# Altium footprint library Components.PcbLib: 111 footprints (part 5 of 7)
Each footprint in its own frame and in the unit in brackets; x right, y up, seen from the top. Pads: shape width x height; smd on the part's side, far side on the other; paste and mask are expansions set on the pad; w line width, h text height; cw(c..) or ccw(c..) is an arc to the next point about the centre after c.
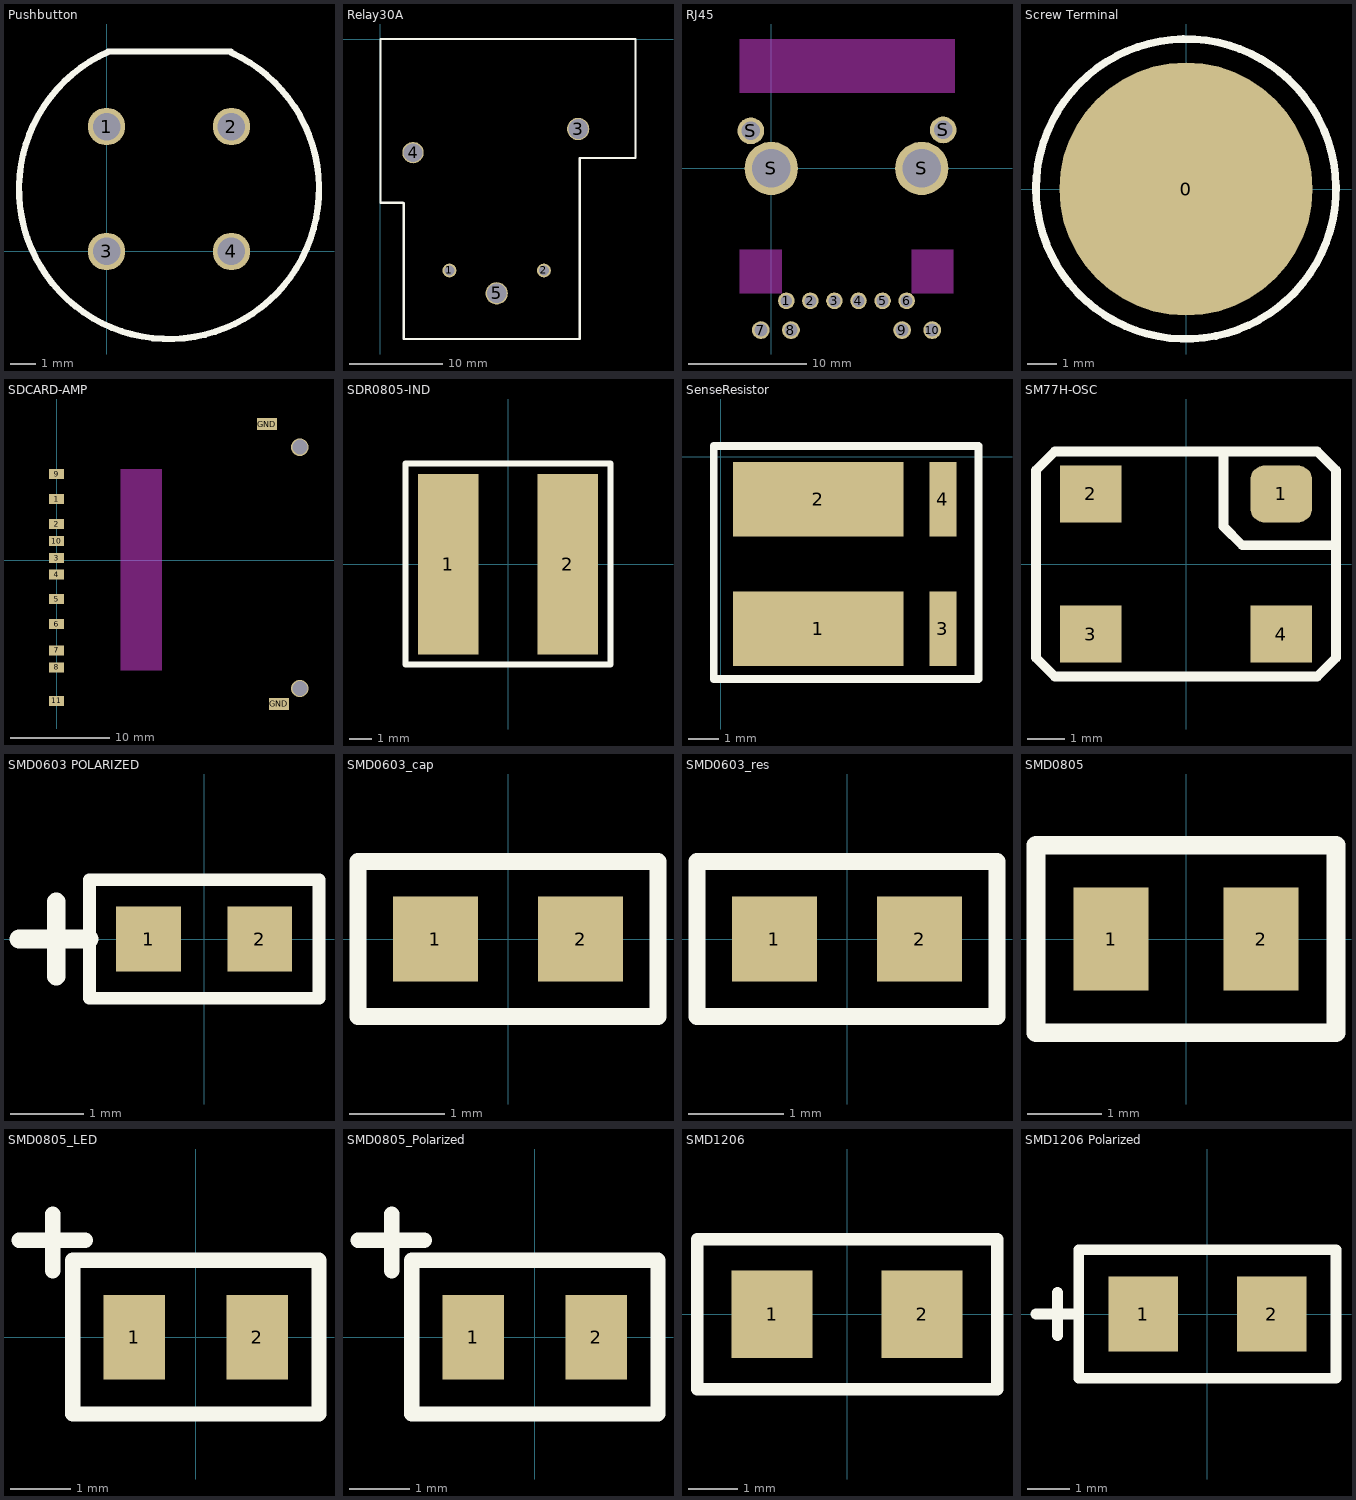
[diagram p4: the footprints below, top view; thin cyan lines are the x and y axes]

## Pushbutton [mm]
pads (4):
  round 1.5 hole 1.1: 1(0,5) 2(5,5) 3(0,0) 4(5,0)
Top Overlay:
  lines w0.254: 0.059,7.981 ccw(c2.5,2.5) 4.983,7.962 ; 0.059,8 4.983,8
3D body: height 14.35, standoff 1.55, extent -3.5,-3.5 8.5,8

## Relay30A [mm]
height 20.4
pads (5):
  round 1.5 hole 1.1: 1(7.417,-24.892) 2(17.577,-24.892)
  round 2.4 hole 2.1: 3(21.26,-9.677) 5(12.497,-27.356)
  round 2.3 hole 2: 4(3.505,-12.217)
Top Overlay:
  lines w0.254: 2.413,-17.602 0,-17.602 0,0 27.432,0 27.432,-12.802 21.412,-12.802 21.412,-32.258 2.489,-32.258 2.489,-17.678

## RJ45 [mm]
pads (14):
  round 1.4 hole 1: 1(1.27,-11.17) 2(3.3,-11.17) 3(5.33,-11.17) 4(7.36,-11.17) 5(9.39,-11.17) 6(11.42,-11.17)
  round 1.5 hole 1.1: 7(-0.88,-13.64) 8(1.66,-13.64) 9(11.04,-13.64) 10(13.58,-13.64)
  round 2.25 hole 1.57: S(-1.72,3.17) S(14.5,3.25)
  round 4.5 hole 3.25: S(0,0) S(12.7,0)
Keep-Out Layer:
  rectangle: 11.811,-10.541 15.367,-6.858
  rectangle: -2.667,-10.541 0.889,-6.858
  rectangle: -2.667,6.35 15.494,10.922
3D body: height 13.49, standoff 0, extent -1.803,-14.605 14.503,10.922

## Screw Terminal [mm]
height 6
pads (1):
  round 8.5 smd: 0(0,0)
Top Overlay:
  lines w0.254: 4.398,2.446 ccw(c0,0) 4.454,2.343

## SDCARD-AMP [mm] "Amphenol 101003136802"
pads (13):
  rect 1.5x1 smd: 1(0,6.1) 2(0,3.6) 3(0,0.2) 4(0,-1.45) 5(0,-3.9) 6(0,-6.4) 7(0,-9.03) 8(0,-10.73) 9(0,8.6) 10(0,1.9) 11(0,-14.08)
  rect 2x1.2 smd: GND(21.01,13.6) GND(22.21,-14.4)
via 24.31,11.3 diameter 1.75 hole 1.5
via 24.31,-12.85 diameter 1.75 hole 1.5
Keep-Out Layer:
  region: 6.4,9.1 10.51,9.1 10.51,-11.03 6.4,-11.03
3D body: height 2.7, standoff 0, extent 0,-14.45 28.9,14.45

## SDR0805-IND [mm]
pads (2):
  rect 2.7x8 smd: 1(-2.65,0) 2(2.65,0)
Top Overlay:
  lines w0.254: -4.547,-4.445 -4.547,4.47 4.547,4.47 4.547,-4.445 -4.547,-4.445
3D body "sdr0805.stp": height 5.3, standoff 0, extent -3.9,-3.9 3.9,3.9

## SenseResistor [mm] "Vishay-Dale Low-Ohm Resistor"
pads (4):
  rect 5.6x2.44 smd: 1(3.2,-5.639) 2(3.2,-1.397)
  rect 0.89x2.44 smd: 3(7.29,-5.639) 4(7.29,-1.397)
Top Overlay:
  lines w0.254: -0.229,-7.29 8.458,-7.29 8.458,0.356 6.248,0.356 -0.229,0.356 -0.229,-7.29
3D body "WSL2726 (0.0005).stp": height 2.94, standoff -0.01, extent 0.993,-6.909 7.593,-0.009

## SM77H-OSC [mil]
pads (4):
  rrect50% 65x60 smd: 1(100,73.5)
  rect 65x60 smd: 2(-100,73.5) 3(-100,-73.5) 4(100,-73.5)
Top Overlay:
  lines w10: 39.37,118.11 39.37,39.37 59.06,19.68 157.48,19.68 ; -157.48,-98.43 -137.8,-118.11 137.8,-118.11 157.48,-98.43 157.48,98.43 137.8,118.11 -137.8,118.11 -157.48,98.43 -157.48,-98.43

## SMD0603 POLARIZED [mil]
pads (2):
  rect 35x35 smd: 1(-30,0) 2(30,0)
Top Overlay:
  lines w7: -62,0 -62,32 62,32 62,-32 -62,-32 -62,2
  lines w10: -100,0 -62,0 ; -80,-20 -80,20
3D body "RES0603.stp": height 17.72, standoff 0, extent -31.49,-15.75 31.5,15.76

## SMD0603_cap [mil]
pads (2):
  rect 35x35 smd: 1(-30,0) 2(30,0)
Top Overlay:
  lines w7: -62,-32 62,-32 62,32 -62,32 -62,2 -62,-32
3D body "CAPC-0603-T0.9-BN.stp": height 35.43, standoff 0, extent -31.5,-17.72 35.43,17.71

## SMD0603_res [mil]
pads (2):
  rect 35x35 smd: 1(-30,0) 2(30,0)
Top Overlay:
  lines w7: -62,-32 62,-32 62,32 -62,32 -62,2 -62,-32
3D body "RES0603.stp": height 17.72, standoff 0, extent -31.49,-15.75 31.5,15.76

## SMD0805 [mil]
pads (2):
  rect 40x55 smd: 1(-40,0) 2(40,0)
Top Overlay:
  lines w10: -80,-50 80,-50 80,50 -80,50 -80,-7.5 -80,-50
3D body "RES0805.stp": height 19.68, standoff 0, extent -39.36,-24.8 39.38,24.42

## SMD0805_LED [mil]
height 35.43
pads (2):
  rect 40x55 smd: 1(-40,0) 2(40,0)
Top Overlay:
  lines w10: -115,63 -72,63 ; -93,43 -93,80 ; -80,-50 80,-50 80,50 -80,50 -80,-7.5 -80,-50
3D body "Surface Mount Chip LED 3.2x1.6mm.stp": height 43.31, standoff -0.39, extent -65,-33 60.98,29.99

## SMD0805_Polarized [mil]
height 35.43
pads (2):
  rect 40x55 smd: 1(-40,0) 2(40,0)
Top Overlay:
  lines w10: -115,63 -72,63 ; -93,43 -93,80 ; -80,-50 80,-50 80,50 -80,50 -80,-7.5 -80,-50
3D body "RES0805.stp": height 19.68, standoff 0, extent -39.36,-24.8 39.38,24.42

## SMD1206 [mil]
pads (2):
  rect 65x70 smd: 1(-60,0) 2(60,0)
Top Overlay:
  lines w10: -120,-60 120,-60 120,60 -120,60 -120,-60
3D body "RES1206.stp": height 21.65, standoff 0, extent -61.02,-30.39 61.03,30.71

## SMD1206 Polarized [mil]
pads (2):
  rect 65x70 smd: 1(-60,0) 2(60,0)
Top Overlay:
  lines w10: -160,0 -120,0 ; -140,-20 -140,20 ; -120,-60 -120,60 120,60 120,-60 -120,-60
3D body "CAPM-TANTA-YL.stp": height 70.87, standoff 0, extent -66.92,-35.43 66.93,35.44